# Altium footprint library pcb2D3D库101.PcbLib: 411 footprints (part 14 of 26)
Each footprint in its own frame and in the unit in brackets; x right, y up, seen from the top. Pads: shape width x height; smd on the part's side, far side on the other; paste and mask are expansions set on the pad; w line width, h text height; cw(c..) or ccw(c..) is an arc to the next point about the centre after c.
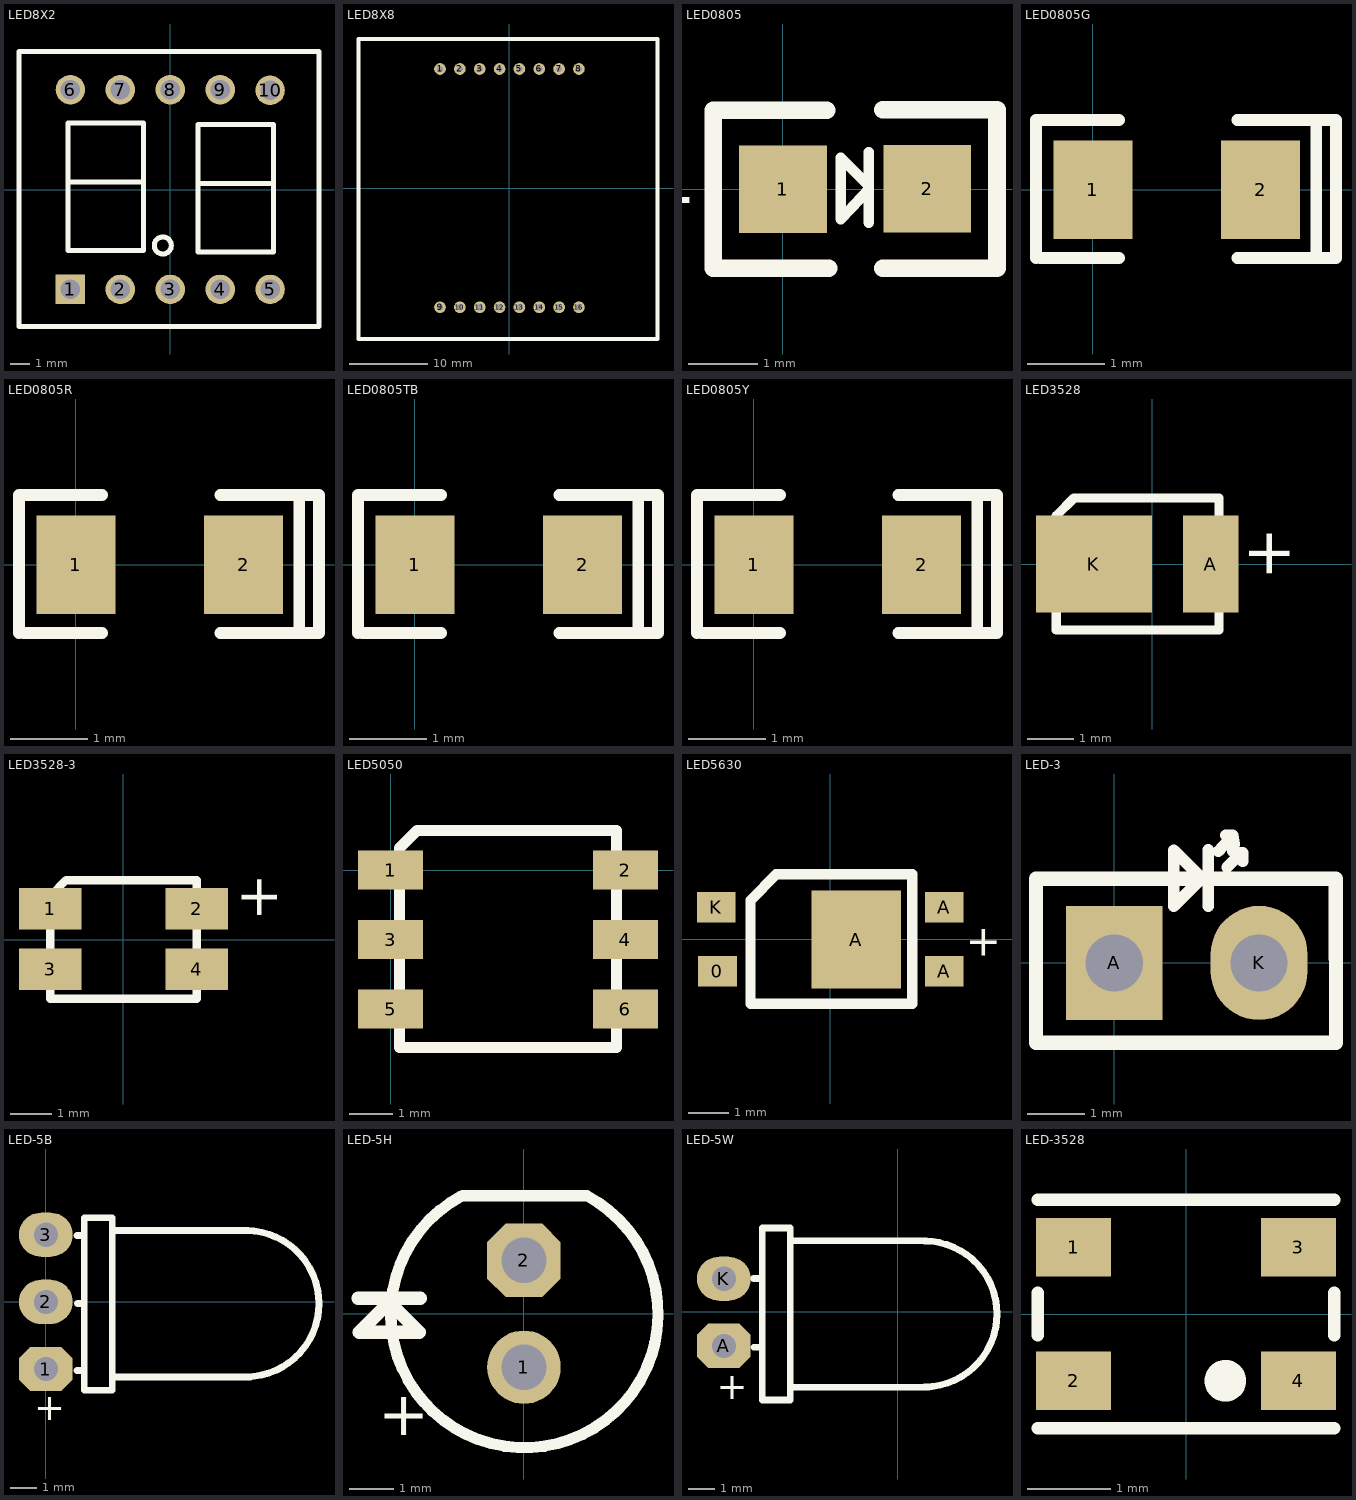
[diagram p13: the footprints below, top view; thin cyan lines are the x and y axes]

## LED8X2 [mm] "DIP; 16 Leads; Row Spacing 7.62 mm; Pitch 2.54 mm"
pads (10):
  rect 1.5x1.5 hole 1: 1(-5.08,-5.08)
  round 1.5 hole 1: 2(-2.54,-5.08) 3(0,-5.08) 4(2.54,-5.08) 5(5.08,-5.08) 6(-5.08,5.08) 7(-2.54,5.08) 8(0,5.08) 9(2.54,5.08) 10(5.08,5.049)
TopOverlay:
  circle w0.254: c-0.381,-2.845 r0.434
  lines w0.254: -5.156,0.381 -1.372,0.381 ; 1.473,0.305 5.258,0.305 ; -7.696,-6.96 7.569,-6.96 7.569,7.015 -7.696,7.015 -7.696,-6.96 ; -5.207,-3.099 -5.207,3.378 -1.372,3.378 -1.372,-3.099 -5.207,-3.099 ; 1.422,-3.175 5.258,-3.175 5.258,3.302 1.422,3.302 1.422,-3.175
3D body "LED Digital Tube 8X2.STEP": height 7.2, standoff -1.9, extent -7.551,-6.985 7.449,7.015

## LED8X8 [mm]
pads (16):
  round 1.5 hole 0.8: 1(-8.89,15.253) 2(-6.35,15.253) 3(-3.81,15.253) 4(-1.27,15.253) 5(1.27,15.253) 6(3.81,15.253) 7(6.35,15.253) 8(8.89,15.253) 9(-8.89,-15.253) 10(-6.35,-15.253) 11(-3.81,-15.253) 12(-1.27,-15.253) 13(1.27,-15.253) 14(3.81,-15.253) 15(6.35,-15.253) 16(8.89,-15.253)
TopOverlay:
  lines w0.508: -19.355,-19.317 -19.355,19.088 18.974,19.088 18.974,-19.317 -19.355,-19.317
3D body "38x38_8x8_LED.step": height 10.4, standoff -4, extent -19.3,-19.313 19,18.987

## LED0805 [mm] "1/8W"
pads (2):
  rect 1.27x1.27 smd: 1(0,0) 2(2.09,0.005)
TopOverlay:
  lines w0.152: 1.245,-0.483 1.245,0.533 ; 1.245,0 0.838,-0.432 0.838,0.457 1.245,0.051
  lines w0.254: 0.635,1.143 -1.011,1.143 -1.011,-1.143 0.66,-1.143 ; 1.448,-1.143 3.099,-1.143 3.099,1.148 1.448,1.148
  text "+" at -1.245,-0.483 h0.76
3D body: height 0.5, standoff 0, extent 0.051,-0.635 0.279,0.635
3D body: height 0.5, standoff 0, extent 1.803,-0.635 2.032,0.635
3D body: height 0.5, standoff 0, extent 0.279,-0.635 1.803,0.635
3D body: height 0.46, standoff 0, extent 0.774,-0.254 1.309,0.305

## LED0805G [mil]
pads (2):
  rect 40x50 smd: 1(0,0) 2(85,0)
TopOverlay:
  lines w5.98: 113.15,-34.61 123.15,-34.61 ; 113.15,35.39 123.15,35.39
  lines w6: -28.86,-34.61 -28.86,35.39 13.15,35.39 ; -26.85,-34.61 13.15,-34.61 ; 73.15,-34.61 113.15,-34.61 113.15,35.39 73.15,35.39 ; 123.15,-34.61 123.15,35.39
3D body "User Library-User Library-led_0805 GRE.STEP": height 43.31, standoff 0, extent 3.39,-24.21 82.91,25

## LED0805R [mil]
pads (2):
  rect 40x50 smd: 1(0,0) 2(85,0)
TopOverlay:
  lines w5.98: 113.15,-34.61 123.15,-34.61 ; 113.15,35.39 123.15,35.39
  lines w6: -28.86,-34.61 -28.86,35.39 13.15,35.39 ; -26.85,-34.61 13.15,-34.61 ; 73.15,-34.61 113.15,-34.61 113.15,35.39 73.15,35.39 ; 123.15,-34.61 123.15,35.39
3D body "User Library-led_0805.STEP": height 43.31, standoff 0, extent 3.39,-24.21 82.91,25

## LED0805TB [mil]
pads (2):
  rect 40x50 smd: 1(0,0) 2(85,0)
TopOverlay:
  lines w5.98: 113.15,-34.61 123.15,-34.61 ; 113.15,35.39 123.15,35.39
  lines w6: -28.86,-34.61 -28.86,35.39 13.15,35.39 ; -26.85,-34.61 13.15,-34.61 ; 73.15,-34.61 113.15,-34.61 113.15,35.39 73.15,35.39 ; 123.15,-34.61 123.15,35.39
3D body "SW3dPS-LED SMD0805.STEP": height 33.45, standoff 0.23, extent -2.07,-17.71 79.13,17.97

## LED0805Y [mil]
pads (2):
  rect 40x50 smd: 1(0,0) 2(85,0)
TopOverlay:
  lines w5.98: 113.15,-34.61 123.15,-34.61 ; 113.15,35.39 123.15,35.39
  lines w6: -28.86,-34.61 -28.86,35.39 13.15,35.39 ; -26.85,-34.61 13.15,-34.61 ; 73.15,-34.61 113.15,-34.61 113.15,35.39 73.15,35.39 ; 123.15,-34.61 123.15,35.39
3D body "User Library-User Library-led_0805 YEL.STEP": height 43.31, standoff 0, extent 3.39,-24.21 82.92,25

## LED3528 [mm]
pads (2):
  rect 1.2x2.1 smd: A(1.257,0)
  rect 2.5x2.1 smd: K(-1.257,0)
TopOverlay:
  lines w0.2: -2.07,-1.422 1.435,-1.422 1.435,1.422 -1.689,1.422 -2.07,1.041 -2.07,-1.422
  text "+" at 2.959,-0.356 h1
3D body "LED3528.step": height 1.8, standoff 0, extent -2.093,-1.4 1.407,1.4

## LED3528-3 [mm]
pads (4):
  rect 1.5x1 smd: 1(-1.753,0.737) 2(1.753,0.737) 3(-1.753,-0.711) 4(1.753,-0.711)
TopOverlay:
  lines w0.2: -1.753,-1.422 1.753,-1.422 1.753,1.422 -1.372,1.422 -1.753,1.041 -1.753,-1.422
  text "+" at 3.683,0.436 h1
Mechanical2:
  text "+" at 0.508,-0.33 h1
3D body "LED3528.step": height 1.8, standoff 0, extent -1.775,-1.4 1.725,1.4

## LED5050 [mm]
pads (6):
  rect 1.5x0.9 smd: 1(0,0) 2(5.41,0) 3(0,-1.6) 4(5.41,-1.6) 5(0,-3.2) 6(5.41,-3.2)
TopOverlay:
  lines w0.254: 0.686,0.914 5.207,0.914 5.207,-4.089 0.203,-4.089 0.203,0.508 0.61,0.914 0.991,0.914
3D body "User Library-smd_led_5050.step": height 1.6, standoff 0, extent 0.073,-4.075 5.373,0.925

## LED5630 [mm]
pads (5):
  rect 0.95x0.75 smd: 0(-2.769,-0.781) A(2.794,-0.781) A(2.794,0.781) K(-2.794,0.781)
  rect 2.2x2.4 smd: A(0.635,-0.006)
TopOverlay:
  lines w0.254: -1.956,-1.581 2.007,-1.581 2.007,1.594 -1.321,1.594 -1.956,0.959 -1.956,-1.581
  text "+" at 3.327,-0.4 h0.76
3D body "User Library-5630.step": height 0.95, standoff -0.01, extent -2.775,-1.457 2.826,1.543

## LED-3 [mm]
pads (2):
  rect 1.7x2 hole 1: A(0,0)
  oval 1.7x2 hole 1: K(2.54,0)
TopOverlay:
  lines w0.2: 1.646,0.991 1.646,1.981 ; 1.824,1.955 2.078,2.234 ; 1.951,2.234 2.078,2.234 ; 1.976,1.675 2.23,1.929 2.078,1.955 ; 2.103,2.082 2.078,2.234 ; 2.256,1.777 2.256,1.929 ; 1.041,0.994 1.532,1.485 1.041,1.975 1.041,0.994
  lines w0.254: -1.372,-1.397 -1.372,1.473 3.884,1.473 3.887,-1.397 -1.372,-1.397
3D body "LED-RED3.STEP": height 5.38, standoff -3.17, extent -0.722,-2.019 3.262,1.473

## LED-5B [mm]
pads (3):
  oct 2x1.651 hole 0.9 mask+0.03: 1(0,-2.502)
  oval 2x1.651 hole 0.9 mask+0.03: 2(0,0) 3(0,2.502)
TopOverlay:
  lines w0.254: 1.164,-2.551 1.393,-2.551 ; 1.164,2.478 1.393,2.478 ; 1.177,-0.062 1.406,-0.062 ; 2.472,-2.798 7.629,-2.798 ; 2.549,2.663 7.527,2.663 ; 7.477,-2.788 ccw(c7.454,-0.066) 7.476,2.656 ; 1.431,-3.294 1.431,3.132 2.472,3.132 2.472,-3.294 1.431,-3.294
  text "+" at -0.423,-4.405 h1
3D body "LED5-BW.STEP": height 0.87, standoff -7.2, extent -0.415,-3.115 11.108,2.884

## LED-5H [mm]
pads (2):
  oval 1.65x1.651 hole 1.016 mask+0.03: 1(0,-1.2)
  oct 1.65x1.651 hole 1.016 mask+0.03: 2(0,1.2)
TopOverlay:
  lines w0.254: -1.4,2.644 ccw(c0.009,-0.005) 1.411,2.647 -1.378,2.647
  lines w0.3: -3.725,0.351 -2.328,0.351 ; -3.7,-0.411 -3.027,0.262 -2.354,-0.411 -2.608,-0.411 -3.7,-0.411
  text "+" at -3.268,-2.723 h1
3D body "LED5_RED.STEP": height 8.6, standoff -2, extent -2.846,-2.891 2.853,2.459

## LED-5W [mm]
pads (2):
  oct 2x1.651 hole 0.9 mask+0.03: A(-6.486,-1.271)
  oval 2x1.651 hole 0.9 mask+0.03: K(-6.486,1.23)
TopOverlay:
  lines w0.254: -5.385,1.245 -5.055,1.245 ; -5.359,-1.321 -5.105,-1.321 ; -4.013,-2.813 1.143,-2.813 ; -3.937,2.648 1.041,2.648 ; 0.991,-2.802 ccw(c0.969,-0.08) 0.991,2.642 ; -5.055,-3.283 -5.055,3.117 -4.013,3.117 -4.013,-3.283 -5.055,-3.283
  text "+" at -6.756,-3.251 h1
3D body "LED5-H.STEP": height 6, standoff -2.07, extent -6.849,-3.073 4.674,2.927

## LED-3528 [mm]
pads (4):
  rect 0.9x0.7 smd: 1(-1.35,0.8) 2(-1.35,-0.8) 3(1.35,0.8) 4(1.35,-0.8)
TopOverlay:
  circle w0.25: c0.472,-0.802 r0.125
  lines w0.152: -1.778,-1.372 1.778,-1.372 ; -1.778,-0.254 -1.778,0.254 ; -1.778,1.372 1.778,1.372 ; 1.778,-0.254 1.778,0.254
3D body "LED-3528.STEP": height 1.95, standoff 0, extent -1.747,-1.379 1.754,1.371